# Altium footprint library 2-Pcblib_Cap.PcbLib: 73 footprints (part 2 of 5)
Each footprint in its own frame and in the unit in brackets; x right, y up, seen from the top. Pads: shape width x height; smd on the part's side, far side on the other; paste and mask are expansions set on the pad; w line width, h text height; cw(c..) or ccw(c..) is an arc to the next point about the centre after c.
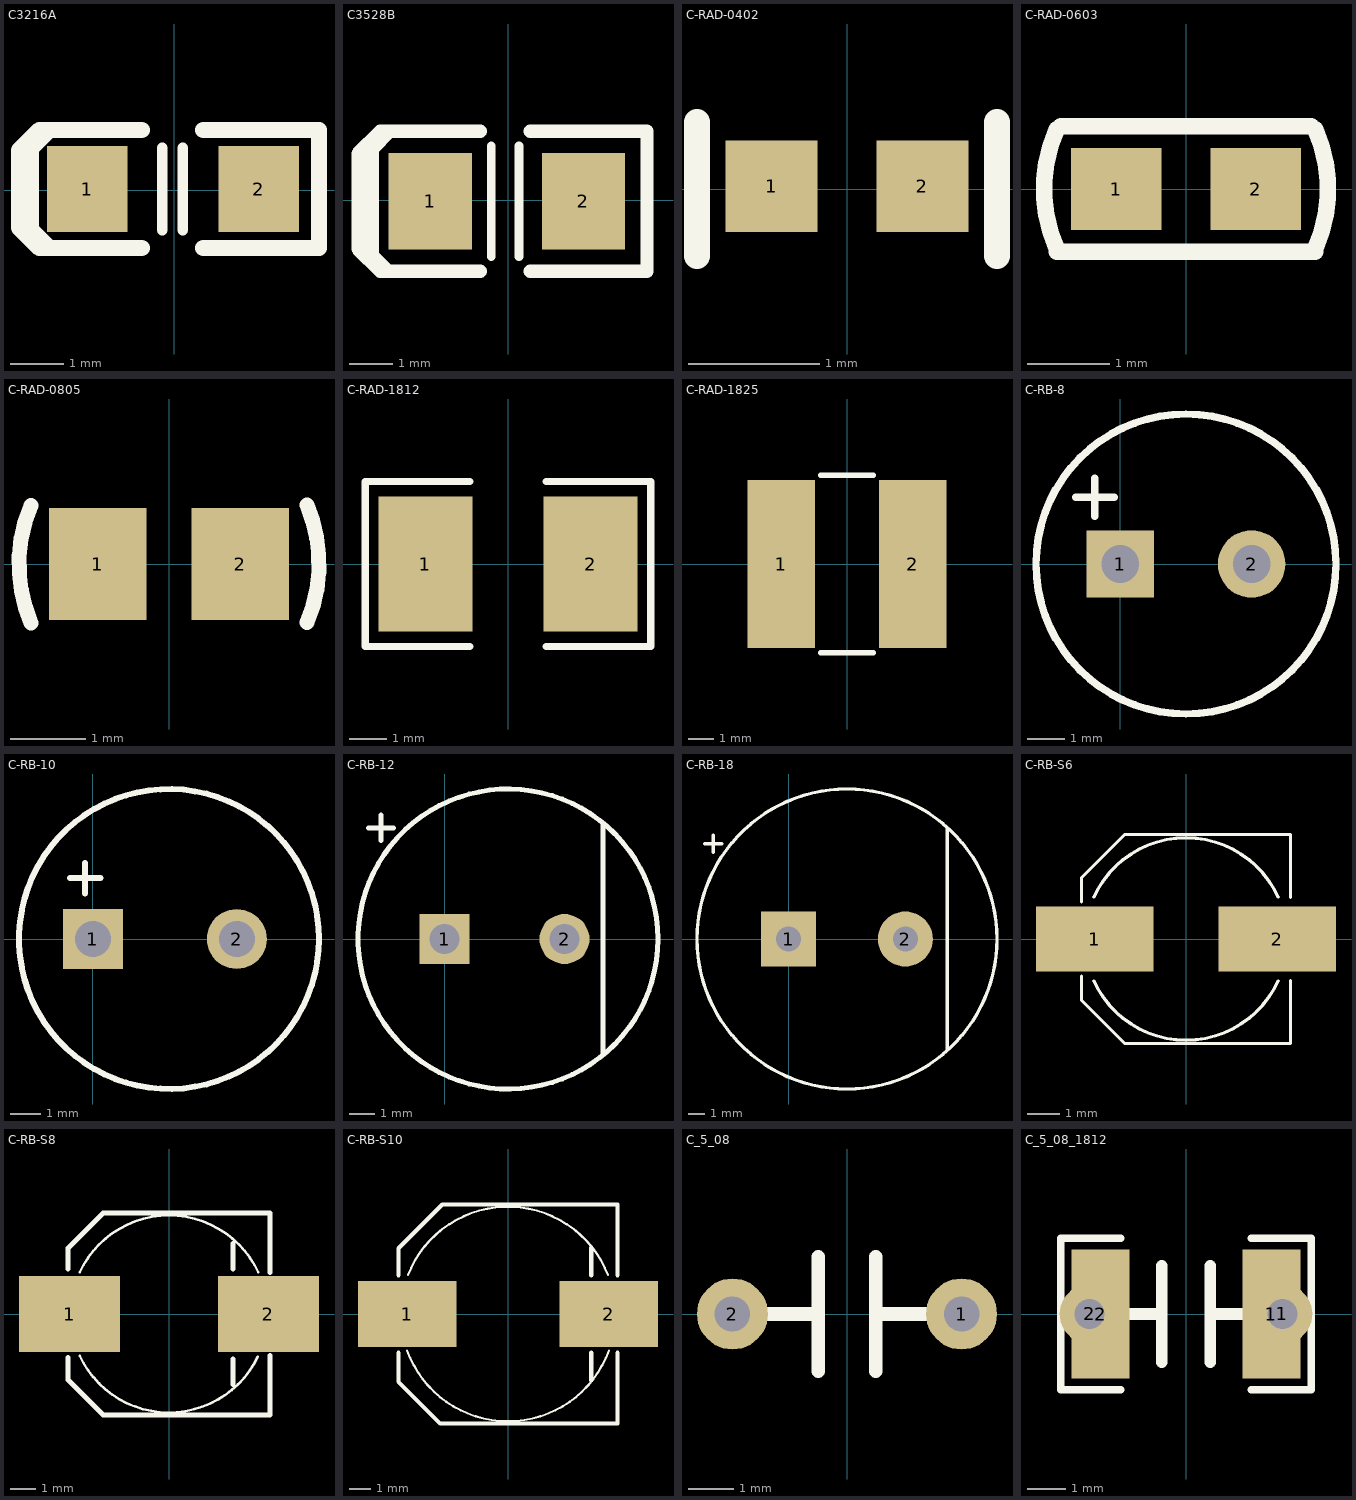
[diagram p1: the footprints below, top view; thin cyan lines are the x and y axes]

## C3216A [mm]
pads (2):
  rect 1.5x1.6 smd: 1(-1.626,0.025) 2(1.574,0.025)
Top Overlay:
  lines w0.2: -2.709,-0.797 -2.709,0.931 ; -2.626,-0.975 -2.626,1.025 ; -2.626,-0.737 -2.599,-0.737 -2.261,-1.075 ; -2.626,0.787 -2.599,0.787 -2.261,1.125 ; -0.229,-0.737 -0.229,0.787 ; 0.152,-0.737 0.152,0.787
  lines w0.305: -0.61,-1.075 -2.515,-1.075 -2.896,-0.694 -2.896,0.744 -2.515,1.125 -0.61,1.125 ; 0.533,-1.075 2.692,-1.075 2.692,1.125 0.533,1.125
3D body: height 1.6, standoff 0, extent -1.575,-0.762 1.625,0.838

## C3528B [mm]
pads (2):
  rect 1.9x2.2 smd: 1(-1.778,-0.025) 2(1.722,-0.025)
Top Overlay:
  lines w0.2: -3.195,-1.276 -3.195,1.301 ; -3.048,-1.422 -3.048,1.154 -2.667,1.535 ; -3.048,-1.168 -3.048,-1.244 -2.667,-1.625 ; -0.381,-1.295 -0.381,1.245 ; 0.254,-1.295 0.254,1.245
  lines w0.3: -3.429,-1.117 -3.429,1.067 ; 3.175,-1.625 3.175,1.575
  lines w0.305: -3.429,-1.117 -2.921,-1.625 -0.635,-1.625 ; -3.429,1.067 -2.921,1.575 -0.635,1.575 ; 0.508,-1.625 3.175,-1.625 ; 0.508,1.575 3.175,1.575
3D body: height 1.9, standoff 0, extent -1.753,-1.422 1.747,1.378

## C-RAD-0402 [mm]
height 0.55
pads (2):
  rect 0.7x0.7 smd: 1(-0.575,0.021) 2(0.575,0.021)
Top Overlay:
  lines w0.2: -1.143,-0.508 -1.143,0.508 ; 1.143,-0.508 1.143,0.508
3D body: height 0.2, standoff 0, extent -0.5,-0.254 0.5,0.346

## C-RAD-0603 [mm]
height 0.6
pads (2):
  rect 1.1x1 smd: 1(-0.85,0) 2(0.85,0)
Top Overlay:
  lines w0.2: -1.574,-0.762 1.574,-0.762 ; -1.574,-0.727 cw(c0.048,0) -1.574,0.727 ; -1.524,0.762 1.524,0.762 ; 1.574,-0.727 ccw(c-0.048,0) 1.574,0.727
3D body: height 0.3, standoff 0, extent -0.762,-0.381 0.838,0.419

## C-RAD-0805 [mm]
height 1
pads (2):
  rect 1.3x1.5 smd: 1(-0.95,0) 2(0.95,0)
Top Overlay:
  lines w0.2: -1.842,0.779 ccw(c0,0) -1.838,-0.789 ; 1.838,0.789 cw(c0,0) 1.842,-0.779
3D body: height 0.78, standoff 0, extent -0.889,-0.635 1.111,0.615

## C-RAD-1812 [mm]
height 1
pads (2):
  rect 2.5x3.6 smd: 1(-2.2,0) 2(2.2,0)
Top Overlay:
  lines w0.2: -1.016,-2.2 -3.81,-2.2 -3.81,2.2 -1.016,2.2 ; 1.016,-2.2 3.81,-2.2 3.81,2.2 1.016,2.2
3D body: height 1.6, standoff 0, extent -2.123,-1.651 2.377,1.549

## C-RAD-1825 [mm]
pads (2):
  rect 2.6x6.5 smd: 1(-2.54,0) 2(2.54,0)
Top Overlay:
  lines w0.2: -1.016,-3.429 1.016,-3.429 ; -1.016,3.429 1.016,3.429
3D body: height 2.54, standoff 0, extent -2.81,-3.175 2.81,3.226

## C-RB-8 [mm] "直插电解电容"
height 12
pads (2):
  rect 1.8x1.8 hole 1: 1(0,0)
  round 1.8 hole 1: 2(3.5,0)
Top Overlay:
  circle w0.2: c1.75,0 r4
  lines w0.2: -1.185,1.778 -0.169,1.778 ; -0.677,1.27 -0.677,2.286
3D body: height 11.53, standoff -3.98, extent -2.247,-3.937 5.803,4.114

## C-RB-10 [mm] "直插电解电容"
height 16
pads (2):
  rect 2x2 hole 1.2: 1(0,0)
  round 2 hole 1.2: 2(4.8,0)
Top Overlay:
  circle w0.2: c2.54,0 r5
  lines w0.2: -0.762,2.032 0.254,2.032 ; -0.254,1.524 -0.254,2.54
3D body: height 10.16, standoff -2.3, extent -2.54,-4.953 7.62,5.207

## C-RB-12 [mm] "直插电解电容"
height 20
pads (2):
  rect 2x2 hole 1.2: 1(0,0)
  round 2 hole 1.2: 2(4.8,0)
Top Overlay:
  circle w0.2: c2.54,0 r6
  lines w0.2: -3.048,4.445 -2.032,4.445 ; -2.54,3.937 -2.54,4.953 ; 6.35,-4.572 6.35,4.572
3D body: height 13, standoff -13.8, extent -2.865,-5.461 7.945,5.339

## C-RB-18 [mm] "直插电解电容"
height 20
pads (2):
  rect 3.3x3.3 hole 1.5: 1(0,0)
  round 3.3 hole 1.5: 2(7,0)
Top Overlay:
  circle w0.2: c3.5,0 r9
  lines w0.2: -5.037,5.715 -4.021,5.715 ; -4.529,5.207 -4.529,6.223 ; 9.525,-6.604 9.525,6.604
3D body: height 16, standoff -2, extent -5.571,-9.073 12.429,8.89

## C-RB-S6 [mm] "贴片电解"
height 7
pads (2):
  rect 3.6x2 smd: 1(-2.794,0) 2(2.794,0)
Top Overlay:
  lines w0.1: -3.2,-1.143 -3.2,-1.88 -1.88,-3.2 3.2,-3.2 3.2,-1.27 ; -3.2,1.143 -3.2,1.88 -1.88,3.2 3.2,3.2 3.2,1.27 ; -2.822,-1.283 ccw(c0,0) 2.822,-1.283 ; -2.822,1.283 cw(c0,0) 2.822,1.283
3D body: height 3.91, standoff 0, extent -3.5,-3.302 3.5,3.298

## C-RB-S8 [mm] "贴片电解"
height 10.2
pads (2):
  rect 4x3 smd: 1(-3.937,0) 2(3.937,0)
Top Overlay:
  lines w0.1: -3.539,-1.643 ccw(c0,0) 3.516,-1.693 ; -3.539,1.643 cw(c0,0) 3.539,1.643
  lines w0.2: -4,-1.714 -4,-2.604 -2.604,-4 4,-4 4,-1.651 ; -4,1.778 -4,2.604 -2.604,4 4,4 4,1.651 ; 2.54,-2.794 2.54,-1.778 ; 2.54,1.778 2.54,2.794
3D body: height 10.3, standoff -0.2, extent -4.85,-4.309 4.85,4.191

## C-RB-S10 [mm] "贴片电解"
height 10.2
pads (2):
  rect 4.5x3 smd: 1(-4.6,0) 2(4.6,0)
Top Overlay:
  lines w0.1: -4.609,-1.664 ccw(c0,0) 4.609,-1.664 ; -4.567,1.776 cw(c0,0) 4.567,1.776
  lines w0.2: -5,-1.778 -5,-3.1 -3.1,-5 5,-5 5,-1.778 ; -5,1.778 -5,3 -3,5 5,5 5,1.778 ; 3.8,-3.032 3.8,-1.778 ; 3.8,1.778 3.8,3.032
3D body: height 10.3, standoff -0.2, extent -5.9,-5.334 5.9,5.166

## C_5_08 [mil]
height 200
pads (2):
  round 62 hole 31: 1(100,0) 2(-100,0)
Top Overlay:
  lines w12: -100,0 -25,0 ; -25,-50 -25,50 ; 25,-50 25,50 ; 25,0 100,0
3D body: height 491.92, standoff -196.85, extent -215.19,-98.43 216.46,98.42

## C_5_08_1812 [mm]
height 5.08
pads (4):
  rect 1.52x3.4 smd: 1(2.25,0) 2(-2.25,0)
  round 1.575 hole 0.787: 1(2.54,0) 2(-2.54,0)
Top Overlay:
  lines w0.2: -1.714,-2 -3.3,-2 -3.3,2 -1.714,2 ; 1.714,-2 3.277,-2 ; 1.714,2 3.3,2 3.3,-2
  lines w0.305: -2.54,0 -0.635,0 ; -0.635,-1.27 -0.635,1.27 ; 0.635,-1.27 0.635,1.27 ; 0.635,0 2.54,0
3D body: height 1.6, standoff 0, extent -2.288,-1.6 2.212,1.6